# Altium schematic symbol library SignalCommunications.SCHLIB: 804 symbols (part 2 of 9) (continued)
## WE-LAN-10/100/1000-BASE-T,749020100
designator T?, comment <b>LAN-Transformer WE-LAN 10/10/1000 Base Tx</b><p> / - Compliant with IEEE 802.3 standards<br> / - SMD<p> / -- Ethernet<br> / -- Power over Ethernet<br> / -- 1 Gigabit Ethernet<br> / -- Compliant with most IC's for ethernet applications like Intel, AMD, Globespan and Realtek<br> / -- Hub, Router, Switch
MANUFACTURER: Würth Elektronik eiSos GmbH; CREATED-BY: Christin Zierenner; COMPANY-URL: http://www.we-online.de; CREATED-DATE: June 2012; DATASHEET-URL: http://katalog.we-online.de/kataloge/eisos/media/pdf/749020100.pdf
footprint 749020100
pins: 1 D+, 2 D-, 3 TD1, 6 TD2, 7 D1+, 8 D1-, 9 X1-, 10 X1+, 11 TX1, 14 TX, 15 X-, 16 X+

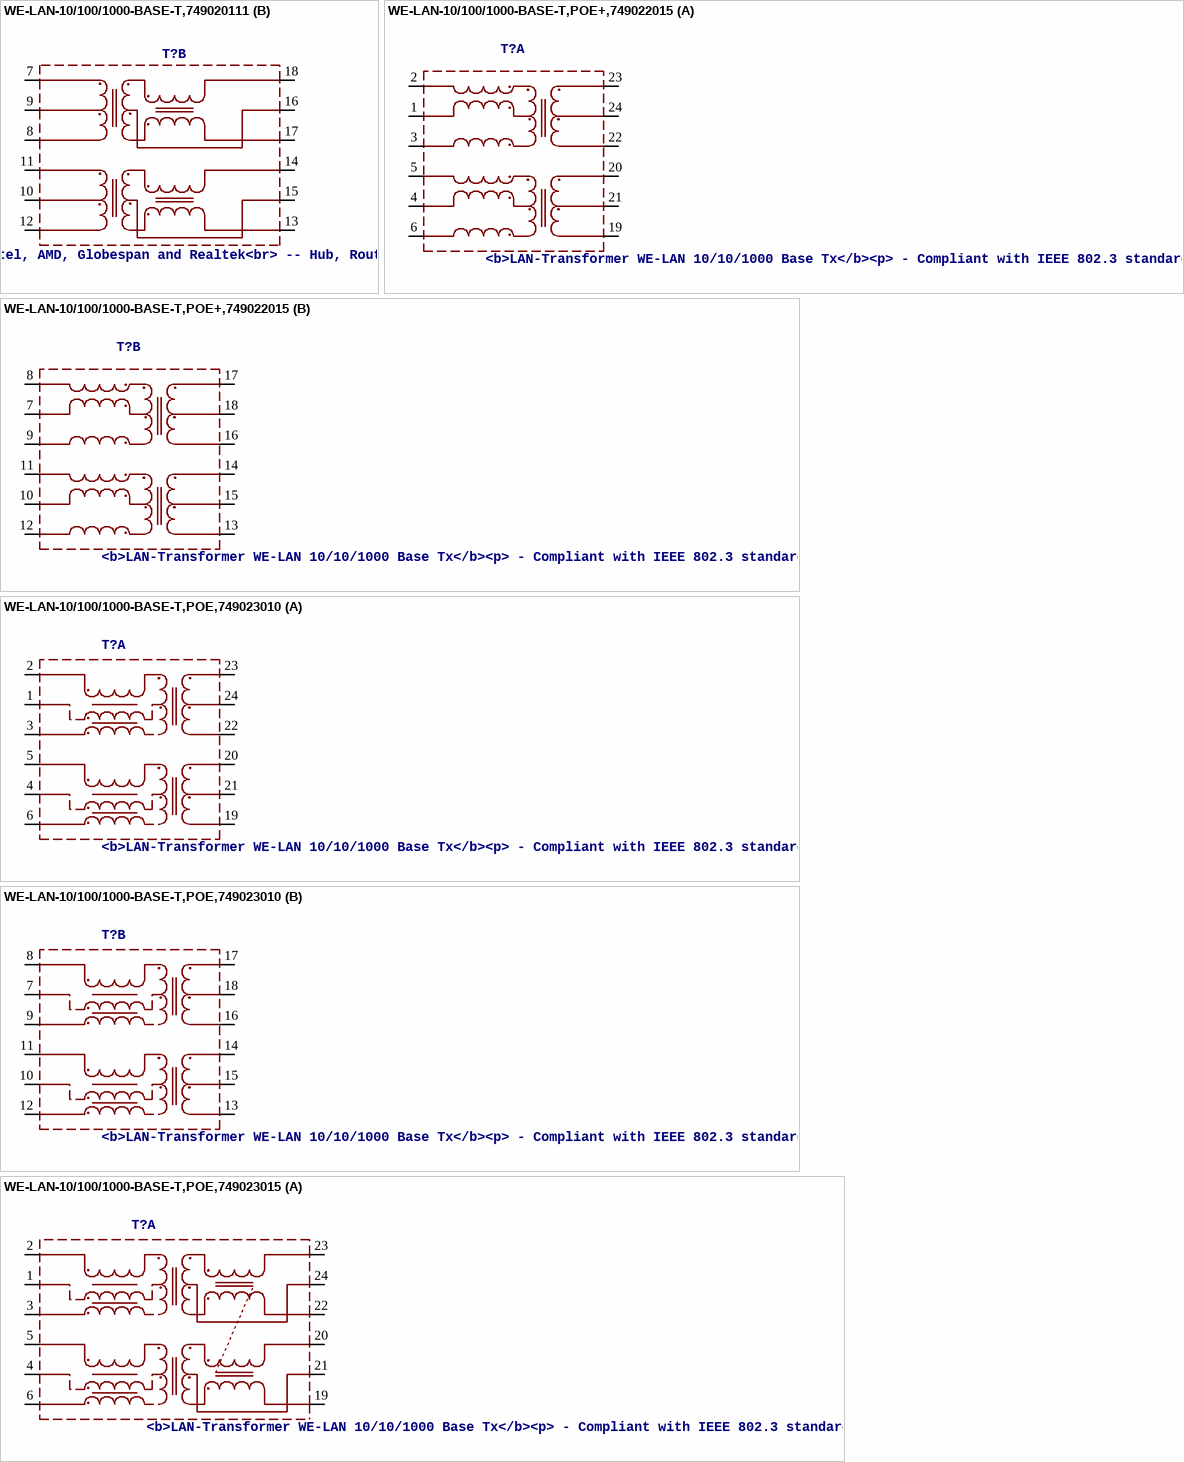
[diagram p7: symbols WE-LAN-10/100/1000-BASE-T,749020111 to WE-LAN-10/100/1000-BASE-T,POE,749023015]

## WE-LAN-10/100/1000-BASE-T,749020111
designator T?, comment <b>LAN-Transformer WE-LAN 10/10/1000 Base Tx</b><p> / - Compliant with IEEE 802.3 standards<br> / - SMD<p> / -- Ethernet<br> / -- Power over Ethernet<br> / -- 1 Gigabit Ethernet<br> / -- Compliant with most IC's for ethernet applications like Intel, AMD, Globespan and Realtek<br> / -- Hub, Router, Switch
MANUFACTURER: Würth Elektronik eiSos GmbH; CREATED-BY: Christin Zierenner; COMPANY-URL: http://www.we-online.de; CREATED-DATE: June 2012; DATASHEET-URL: http://katalog.we-online.de/kataloge/eisos/media/pdf/749020111.pdf
footprint 749020111
part A pins: 1 D1-, 2 D1A-, 3 TD1, 4 TD2, 5 D2-, 6 D2A-, 19 X2A-, 20 X2-, 21 TX2, 22 TX1, 23 X1A-, 24 X1-
part B pins: 7 D1-, 8 D1A-, 9 TD1, 10 TD2, 11 D2-, 12 D2A-, 13 X2A-, 14 X2-, 15 TX2, 16 TX1, 17 X1A-, 18 X1-

## WE-LAN-10/100/1000-BASE-T,POE+,749022015
designator T?, comment <b>LAN-Transformer WE-LAN 10/10/1000 Base Tx</b><p> / - Compliant with IEEE 802.3 standards<br> / - SMD<p> / -- Ethernet<br> / -- Power over Ethernet<br> / -- 1 Gigabit Ethernet<br> / -- Compliant with most IC's for ethernet applications like Intel, AMD, Globespan and Realtek<br> / -- Hub, Router, Switch
MANUFACTURER: Würth Elektronik eiSos GmbH; CREATED-BY: Christin Zierenner; COMPANY-URL: http://www.we-online.de; CREATED-DATE: June 2012; DATASHEET-URL: http://katalog.we-online.de/kataloge/eisos/media/pdf/749022015.pdf
footprint 749022015
part A pins: 1 TD1, 2 D1-, 3 D1A-, 4 TD2, 5 D2-, 6 D2A-, 19 X2A-, 20 X2-, 21 TX2, 22 X1A-, 23 X1-, 24 TX1
part B pins: 7 TD1, 8 D1-, 9 D1A-, 10 TD2, 11 D2-, 12 D2A-, 13 X2A-, 14 X2-, 15 TX2, 16 X1A-, 17 X1-, 18 TX1

## WE-LAN-10/100/1000-BASE-T,POE,749023010
designator T?, comment <b>LAN-Transformer WE-LAN 10/10/1000 Base Tx</b><p> / - Compliant with IEEE 802.3 standards<br> / - SMD<p> / -- Ethernet<br> / -- Power over Ethernet<br> / -- 1 Gigabit Ethernet<br> / -- Compliant with most IC's for ethernet applications like Intel, AMD, Globespan and Realtek<br> / -- Hub, Router, Switch
MANUFACTURER: Würth Elektronik eiSos GmbH; CREATED-BY: Christin Zierenner; COMPANY-URL: http://www.we-online.de; CREATED-DATE: June 2012; DATASHEET-URL: http://katalog.we-online.de/kataloge/eisos/media/pdf/749023010.pdf
footprint 749023010
part A pins: 1 TCT1, 2 TD1+, 3 TD1-, 4 TCT2, 5 TD2+, 6 TD2-, 19 MX2-, 20 MX2+, 21 MCT2, 22 MX1-, 23 MX1+, 24 MCT1
part B pins: 7 TCT1, 8 TD1+, 9 TD1-, 10 TCT2, 11 TD2+, 12 TD2-, 13 MX2-, 14 MX2+, 15 MCT2, 16 MX1-, 17 MX1+, 18 MCT1

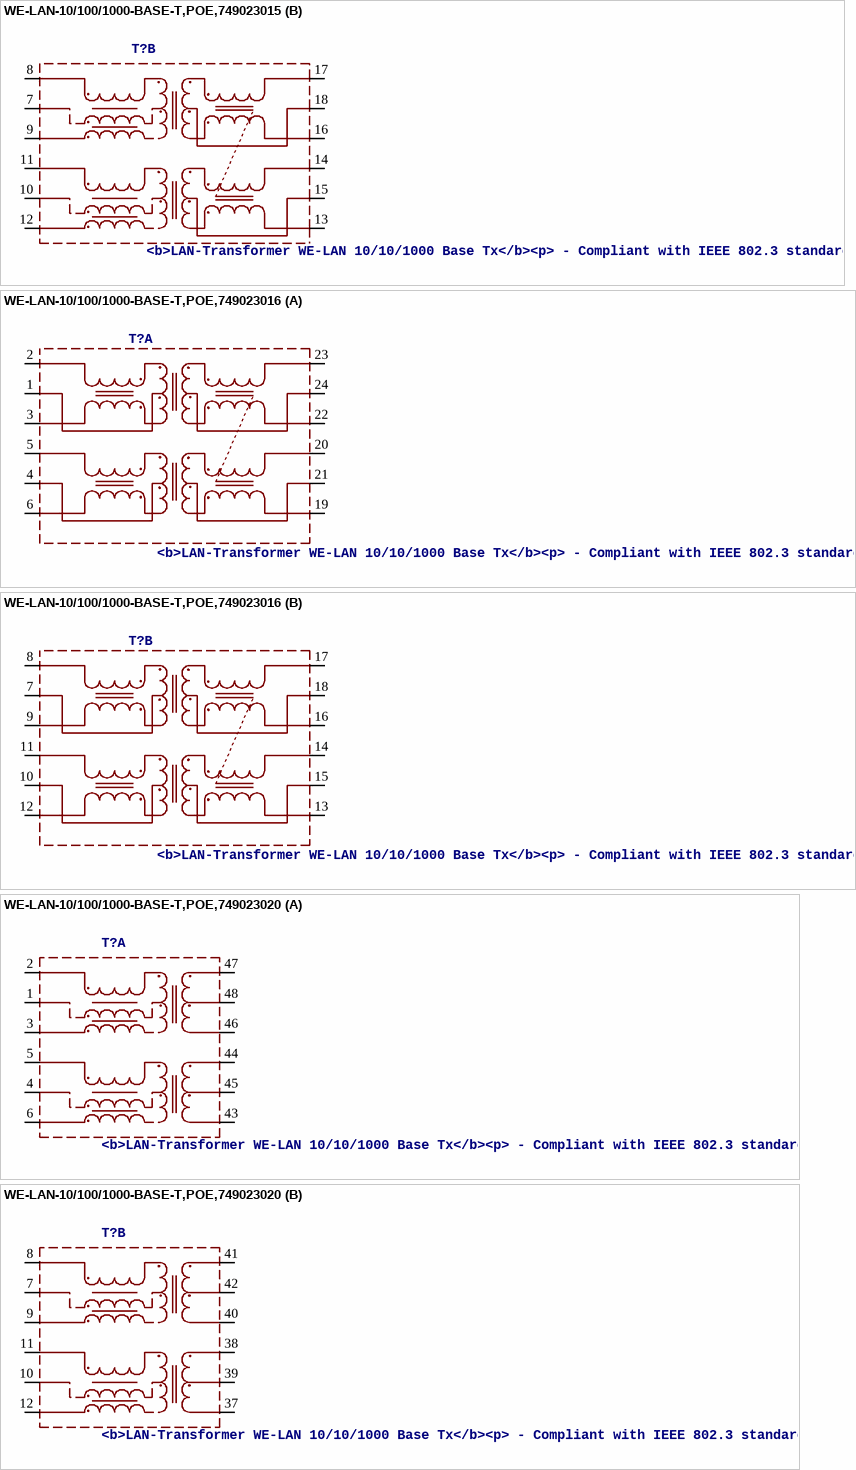
[diagram p8: symbols WE-LAN-10/100/1000-BASE-T,POE,749023015 to WE-LAN-10/100/1000-BASE-T,POE,749023020]

## WE-LAN-10/100/1000-BASE-T,POE,749023015
designator T?, comment <b>LAN-Transformer WE-LAN 10/10/1000 Base Tx</b><p> / - Compliant with IEEE 802.3 standards<br> / - SMD<p> / -- Ethernet<br> / -- Power over Ethernet<br> / -- 1 Gigabit Ethernet<br> / -- Compliant with most IC's for ethernet applications like Intel, AMD, Globespan and Realtek<br> / -- Hub, Router, Switch
MANUFACTURER: Würth Elektronik eiSos GmbH; CREATED-BY: Christin Zierenner; COMPANY-URL: http://www.we-online.de; CREATED-DATE: June 2012; DATASHEET-URL: http://katalog.we-online.de/kataloge/eisos/media/pdf/749023015.pdf
footprint 749023015
part A pins: 1 TD1, 2 D1+, 3 D1-, 4 TD2, 5 D2+, 6 D2-, 19 X2-, 20 X2+, 21 TX2, 22 X1-, 23 X1+, 24 TX1
part B pins: 7 TD1, 8 D1+, 9 D1-, 10 TD2, 11 D2+, 12 D2-, 13 X2-, 14 X2+, 15 TX2, 16 X1-, 17 X1+, 18 TX1

## WE-LAN-10/100/1000-BASE-T,POE,749023016
designator T?, comment <b>LAN-Transformer WE-LAN 10/10/1000 Base Tx</b><p> / - Compliant with IEEE 802.3 standards<br> / - SMD<p> / -- Ethernet<br> / -- Power over Ethernet<br> / -- 1 Gigabit Ethernet<br> / -- Compliant with most IC's for ethernet applications like Intel, AMD, Globespan and Realtek<br> / -- Hub, Router, Switch
MANUFACTURER: Würth Elektronik eiSos GmbH; CREATED-BY: Christin Zierenner; COMPANY-URL: http://www.we-online.de; CREATED-DATE: June 2012; DATASHEET-URL: http://katalog.we-online.de/kataloge/eisos/media/pdf/749023016.pdf
footprint 749023016
part A pins: 1 TD1, 2 D1+, 3 D1-, 4 TD2, 5 D2+, 6 D2-, 19 X2-, 20 X2+, 21 TX2, 22 X1-, 23 X1+, 24 TX1
part B pins: 7 TD1, 8 D1+, 9 D1-, 10 TD2, 11 D2+, 12 D2-, 13 X2-, 14 X2+, 15 TX2, 16 X1-, 17 X1+, 18 TX1

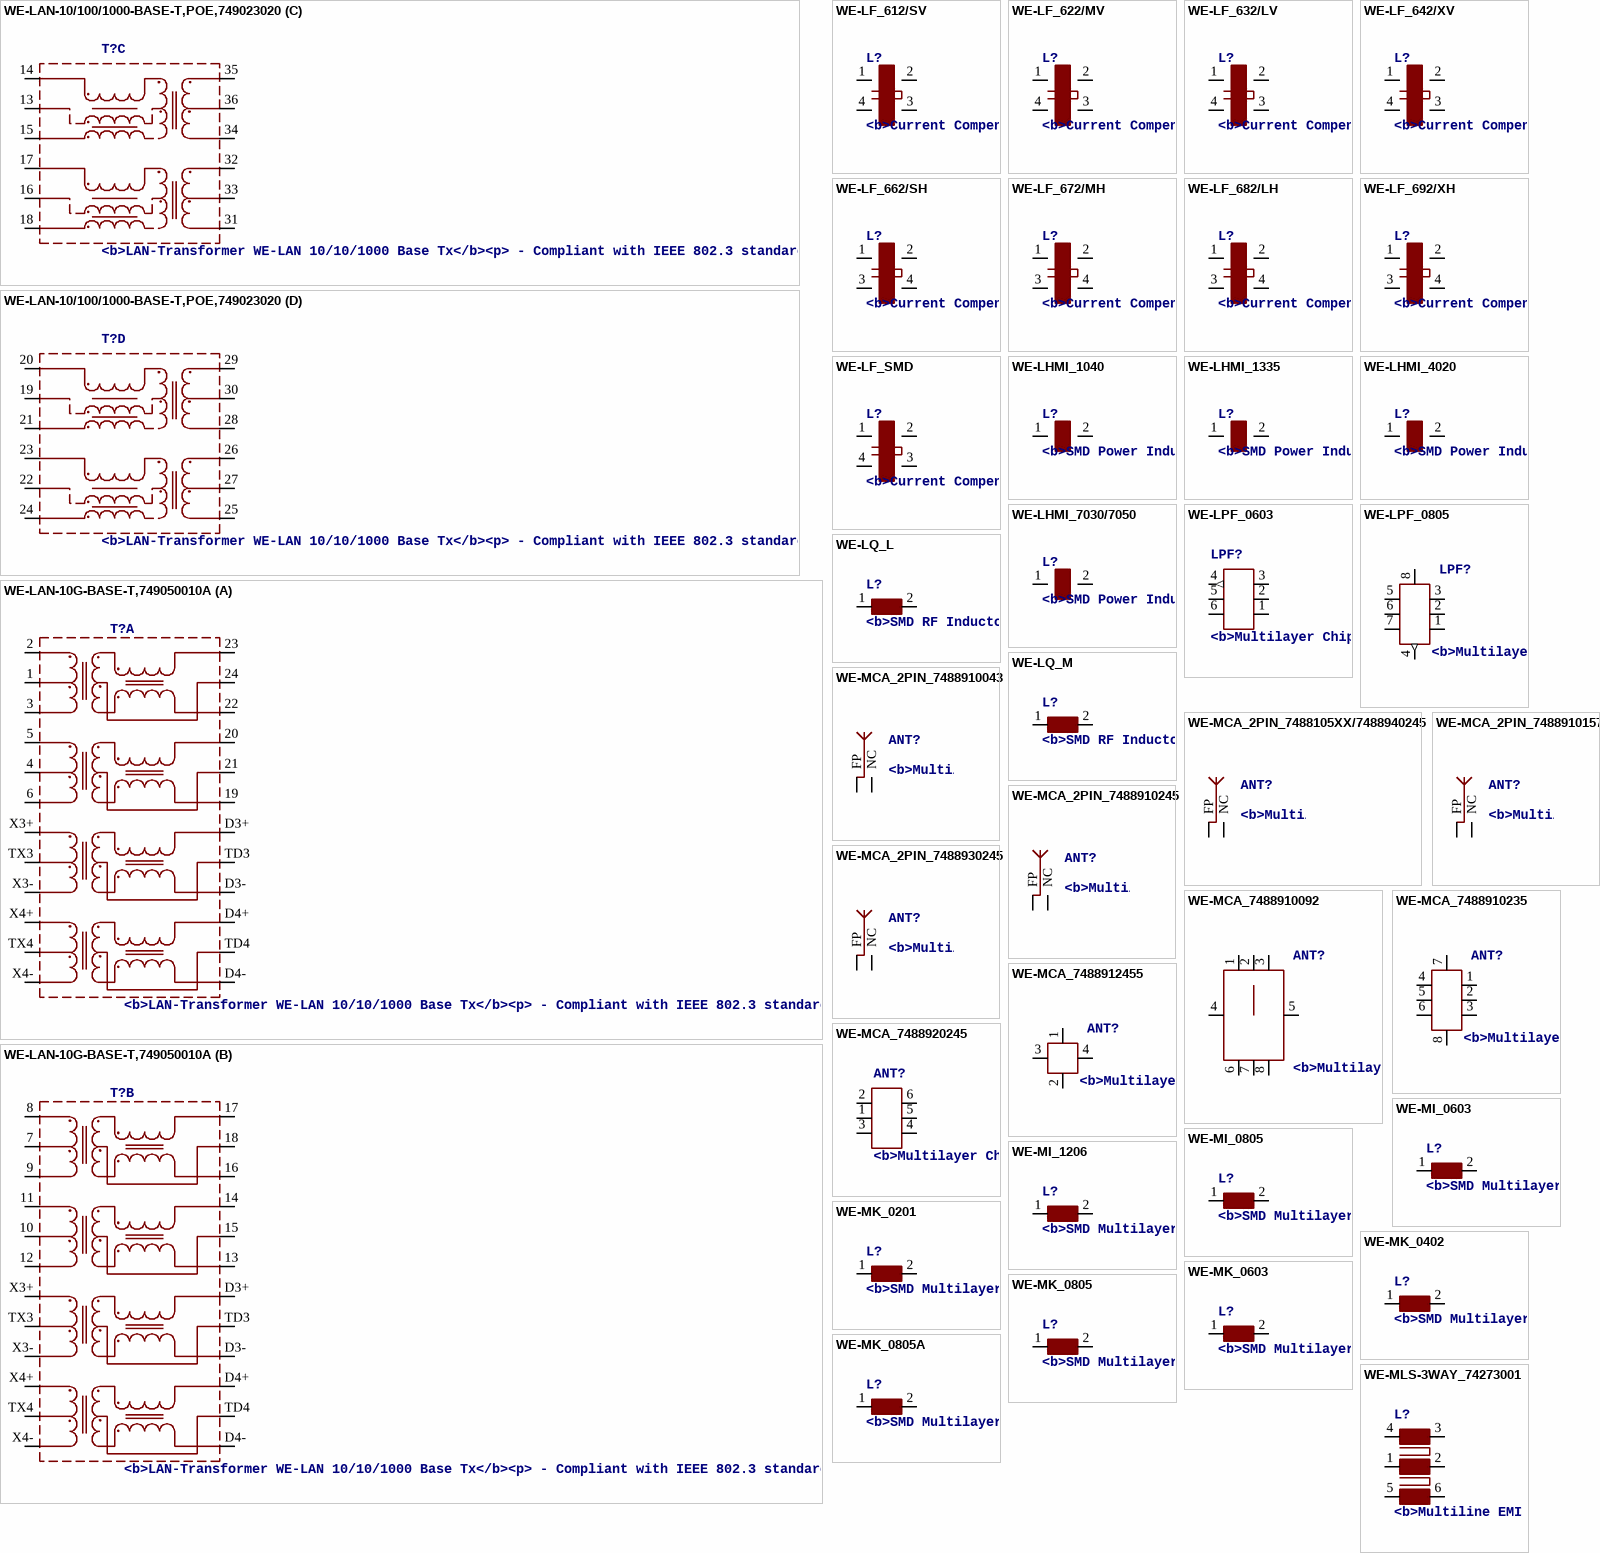
[diagram p9: symbols WE-LAN-10/100/1000-BASE-T,POE,749023020 to WE-MLS-3WAY_74273001]

## WE-LAN-10/100/1000-BASE-T,POE,749023020
designator T?, comment <b>LAN-Transformer WE-LAN 10/10/1000 Base Tx</b><p> / - Compliant with IEEE 802.3 standards<br> / - SMD<p> / -- Ethernet<br> / -- Power over Ethernet<br> / -- 1 Gigabit Ethernet<br> / -- Compliant with most IC's for ethernet applications like Intel, AMD, Globespan and Realtek<br> / -- Hub, Router, Switch
MANUFACTURER: Würth Elektronik eiSos GmbH; CREATED-BY: Christin Zierenner; COMPANY-URL: http://www.we-online.de; CREATED-DATE: June 2012; DATASHEET-URL: http://katalog.we-online.de/kataloge/eisos/media/pdf/749023020.pdf
footprint 749023020
part A pins: 1 TCT1, 2 TD1+, 3 TD1-, 4 TCT2, 5 TD2+, 6 TD2-, 43 MX2-, 44 MX2+, 45 MCT2, 46 MX1-, 47 MX1+, 48 MCT1
part B pins: 7 TCT1, 8 TD1+, 9 TD1-, 10 TCT2, 11 TD2+, 12 TD2-, 37 MX2-, 38 MX2+, 39 MCT2, 40 MX1-, 41 MX1+, 42 MCT1
part C pins: 13 TCT1, 14 TD1+, 15 TD1-, 16 TCT2, 17 TD2+, 18 TD2-, 31 MX2-, 32 MX2+, 33 MCT2, 34 MX1-, 35 MX1+, 36 MCT1
part D pins: 19 TCT1, 20 TD1+, 21 TD1-, 22 TCT2, 23 TD2+, 24 TD2-, 25 MX2-, 26 MX2+, 27 MCT2, 28 MX1-, 29 MX1+, 30 MCT1

## WE-LAN-10G-BASE-T,749050010A
designator T?, comment <b>LAN-Transformer WE-LAN 10/10/1000 Base Tx</b><p> / - Compliant with IEEE 802.3 standards<br> / - SMD<p> / -- Ethernet<br> / -- Power over Ethernet<br> / -- 10 Gigabit Ethernet<br> / -- Compliant with most IC's for ethernet applications like Intel, AMD, Globespan and Realtek<br> / -- Hub, Router, Switch
MANUFACTURER: Würth Elektronik eiSos GmbH; CREATED-BY: Christin Zierenner; COMPANY-URL: http://www.we-online.de; CREATED-DATE: June 2012; DATASHEET-URL: http://katalog.we-online.de/kataloge/eisos/media/pdf/749050010A.pdf
footprint 749050010A
part A pins: 1 TX1, 2 X1+, 3 X1-, 4 TX2, 5 X2+, 6 X2-, 19 D2-, 20 D2+, 21 TD2, 22 D1-, 23 D1+, 24 TD1, D3+, D3-, D4+, D4-, TD3, TD4, TX3, TX4, X3+, X3-, X4+, X4-
part B pins: 7 TX1, 8 X1+, 9 X1-, 10 TX2, 11 X2+, 12 X2-, 13 D2-, 14 D2+, 15 TD2, 16 D1-, 17 D1+, 18 TD1, D3+, D3-, D4+, D4-, TD3, TD4, TX3, TX4, X3+, X3-, X4+, X4-

## WE-LF_612/SV
designator L?, comment <b>Current Compensated Chokes WE-LF</b><p> / Is perfectly suitable for line filter circuits<br> / - Broadband screening because of the top-quality core / material even with the small size<br> / - Ring core choke with segment coiling<br> / - High interferences suppressions for common mode / interferences in low and middle frequency ranges<br> / - Low leakage field <br><br> / -- Line chokes for common mode filtering and protection<br> / -- BUS-systems (USB/CAN), telecommunications<br> / -- Filter for measurement signals<br>
footprint WE-LF_612/SV
pins: 1 3, 2 4, 3 2, 4 1

## WE-LF_622/MV
designator L?, comment <b>Current Compensated Chokes WE-LF</b><p> / Is perfectly suitable for line filter circuits<br> / - Broadband screening because of the top-quality core / material even with the small size<br> / - Ring core choke with segment coiling<br> / - High interferences suppressions for common mode / interferences in low and middle frequency ranges<br> / - Low leakage field <br><br> / -- Line chokes for common mode filtering and protection<br> / -- BUS-systems (USB/CAN), telecommunications<br> / -- Filter for measurement signals<br>
footprint WE-LF_622/MV
pins: 1 3, 2 4, 3 2, 4 1

## WE-LF_632/LV
designator L?, comment <b>Current Compensated Chokes WE-LF</b><p> / Is perfectly suitable for line filter circuits<br> / - Broadband screening because of the top-quality core / material even with the small size<br> / - Ring core choke with segment coiling<br> / - High interferences suppressions for common mode / interferences in low and middle frequency ranges<br> / - Low leakage field <br><br> / -- Line chokes for common mode filtering and protection<br> / -- BUS-systems (USB/CAN), telecommunications<br> / -- Filter for measurement signals<br>
footprint WE-LF_632/LV
pins: 1 3, 2 4, 3 2, 4 1

## WE-LF_642/XV
designator L?, comment <b>Current Compensated Chokes WE-LF</b><p> / Is perfectly suitable for line filter circuits<br> / - Broadband screening because of the top-quality core / material even with the small size<br> / - Ring core choke with segment coiling<br> / - High interferences suppressions for common mode / interferences in low and middle frequency ranges<br> / - Low leakage field <br><br> / -- Line chokes for common mode filtering and protection<br> / -- BUS-systems (USB/CAN), telecommunications<br> / -- Filter for measurement signals<br>
footprint WE-LF_642/XV
pins: 1 3, 2 4, 3 2, 4 1

## WE-LF_662/SH
designator L?, comment <b>Current Compensated Chokes WE-LF</b><p> / Is perfectly suitable for line filter circuits<br> / - Broadband screening because of the top-quality core / material even with the small size<br> / - Ring core choke with segment coiling<br> / - High interferences suppressions for common mode / interferences in low and middle frequency ranges<br> / - Low leakage field <br><br> / -- Line chokes for common mode filtering and protection<br> / -- BUS-systems (USB/CAN), telecommunications<br> / -- Filter for measurement signals<br>
footprint WE-LF_662/SH
pins: 1 3, 2 4, 3 1, 4 2

## WE-LF_672/MH
designator L?, comment <b>Current Compensated Chokes WE-LF</b><p> / Is perfectly suitable for line filter circuits<br> / - Broadband screening because of the top-quality core / material even with the small size<br> / - Ring core choke with segment coiling<br> / - High interferences suppressions for common mode / interferences in low and middle frequency ranges<br> / - Low leakage field <br><br> / -- Line chokes for common mode filtering and protection<br> / -- BUS-systems (USB/CAN), telecommunications<br> / -- Filter for measurement signals<br>
footprint WE-LF_672/MH
pins: 1 3, 2 4, 3 1, 4 2

## WE-LF_682/LH
designator L?, comment <b>Current Compensated Chokes WE-LF</b><p> / Is perfectly suitable for line filter circuits<br> / - Broadband screening because of the top-quality core / material even with the small size<br> / - Ring core choke with segment coiling<br> / - High interferences suppressions for common mode / interferences in low and middle frequency ranges<br> / - Low leakage field <br><br> / -- Line chokes for common mode filtering and protection<br> / -- BUS-systems (USB/CAN), telecommunications<br> / -- Filter for measurement signals<br>
footprint WE-LF_682/LH
pins: 1 3, 2 4, 3 1, 4 2

## WE-LF_692/XH
designator L?, comment <b>Current Compensated Chokes WE-LF</b><p> / Is perfectly suitable for line filter circuits<br> / - Broadband screening because of the top-quality core / material even with the small size<br> / - Ring core choke with segment coiling<br> / - High interferences suppressions for common mode / interferences in low and middle frequency ranges<br> / - Low leakage field <br><br> / -- Line chokes for common mode filtering and protection<br> / -- BUS-systems (USB/CAN), telecommunications<br> / -- Filter for measurement signals<br>
footprint WE-LF_692/XH
pins: 1 3, 2 4, 3 1, 4 2

## WE-LF_SMD
designator L?, comment <b>Current Compensated Chokes WE-LF SMD</b><p> / Is perfectly suitable for line filter circuits<br> / - Broadband screening because of the top-quality core / material even with the small size<br> / - Ring core choke with segment coiling<br> / - High interferences suppressions for common mode / interferences in low and middle frequency ranges<br> / - Low leakage field <br><br> / -- Line chokes for common mode filtering and protection<br> / -- BUS-systems (USB/CAN), telecommunications<br> / -- Filter for measurement signals<br>
footprint WE-LF_SMD
pins: 1 3, 2 4, 3 2, 4 1

## WE-LHMI_1040
designator L?, comment <b>SMD Power Inductor WE-LHMI</b><p> / - Compact design<br> / - Magnetically shielded<br> / - High current capability<br> / - Handles high transient current spikes<br> / - No acounstic noise and no leakage field<br> / - Frequency range up to 5MHz<br><br> / -- DC/DC converter for high current power supplies<br> / -- DC/DC converter for Field Programmable Gate Array (FPGA)<br> / -- POL converter<br> / -- Portable power like PDA, digital camera<br> / -- Mainboards / graphic cards<br> / -- Battery powerded devices
footprint WE-LHMI_1040
pins: 1, 2

## WE-LHMI_1335
designator L?, comment <b>SMD Power Inductor WE-LHMI</b><p> / - Compact design<br> / - Magnetically shielded<br> / - High current capability<br> / - Handles high transient current spikes<br> / - No acounstic noise and no leakage field<br> / - Frequency range up to 5MHz<br><br> / -- DC/DC converter for high current power supplies<br> / -- DC/DC converter for Field Programmable Gate Array (FPGA)<br> / -- POL converter<br> / -- Portable power like PDA, digital camera<br> / -- Mainboards / graphic cards<br> / -- Battery powerded devices
footprint WE-LHMI_1335
pins: 1, 2

## WE-LHMI_4020
designator L?, comment <b>SMD Power Inductor WE-LHMI</b><p> / - Compact design<br> / - Magnetically shielded<br> / - High current capability<br> / - Handles high transient current spikes<br> / - No acounstic noise and no leakage field<br> / - Frequency range up to 5MHz<br><br> / -- DC/DC converter for high current power supplies<br> / -- DC/DC converter for Field Programmable Gate Array (FPGA)<br> / -- POL converter<br> / -- Portable power like PDA, digital camera<br> / -- Mainboards / graphic cards<br> / -- Battery powerded devices
footprint WE-LHMI_4020
pins: 1, 2

## WE-LHMI_7030/7050
designator L?, comment <b>SMD Power Inductor WE-LHMI</b><p> / - Compact design<br> / - Magnetically shielded<br> / - High current capability<br> / - Handles high transient current spikes<br> / - No acounstic noise and no leakage field<br> / - Frequency range up to 5MHz<br><br> / -- DC/DC converter for high current power supplies<br> / -- DC/DC converter for Field Programmable Gate Array (FPGA)<br> / -- POL converter<br> / -- Portable power like PDA, digital camera<br> / -- Mainboards / graphic cards<br> / -- Battery powerded devices
footprint WE-LHMI_7030/7050
pins: 1, 2

## WE-LPF_0603
designator LPF?, comment <b>Multilayer Chip Low-Pass Filters WE-LPF SMD 0603</b><p> / - One inductor and three capacitors or two inductors and five capacitors in one component<br> / - Power capacity up to 3W<br> / - Low insertion loss and high attenuation in the stop-band<br><br> / -- RF-applications in the area of 0.8 to 6 GHz<br> / -- wireless communication systems like DECT,PACS,PHS,GSM, Bluetooth,...
footprint WE-LPF_0603
pins: 1 GND (power), 2 NC, 3 GND (power), 4 OUT (out), 5 GND (power), 6 IN

## WE-LPF_0805
designator LPF?, comment <b>Multilayer Chip Low-Pass Filters WE-LPF SMD 0603</b><p> / - One inductor and three capacitors or two inductors and five capacitors in one component<br> / - Power capacity up to 3W<br> / - Low insertion loss and high attenuation in the stop-band<br><br> / -- RF-applications in the area of 0.8 to 6 GHz<br> / -- wireless communication systems like DECT,PACS,PHS,GSM, Bluetooth,...
footprint WE-LPF_0805
pins: 1 GND (power), 2 NC, 3 GND (power), 4 OUT (out), 5 GND (power), 6 NC, 7 GND (power), 8 IN

## WE-LQ_L
designator L?, comment <b>SMD RF Inductor WE-LQ</b><p> / - High Q at high frequences<br> / - Low DC-resistance<br> / - Miniature chip inductor wound on a special ferrite core<p> / -- Low power DC/DC-converters from Linear Technology, / National Semiconductor, Texas Instruments and / Fairchild Semiconductor ect.<br> / -- Test & measurement equipment<br> / -- EMI-Filtering<br> / -- RF-circuit
footprint WE-LQ_L
pins: 1, 2

## WE-LQ_M
designator L?, comment <b>SMD RF Inductor WE-LQ</b><p> / - High Q at high frequences<br> / - Low DC-resistance<br> / - Miniature chip inductor wound on a special ferrite core<p> / -- Low power DC/DC-converters from Linear Technology, / National Semiconductor, Texas Instruments and / Fairchild Semiconductor ect.<br> / -- Test & measurement equipment<br> / -- EMI-Filtering<br> / -- RF-circuit
footprint WE-LQ_M
pins: 1, 2

## WE-MCA_2PIN_7488105XX/7488940245
designator ANT?, comment <b>Multilayer Chip Antenna WE-MCA</b><br><br> / - SMD Multilayer Chip Antenna<br> / - Extremely low profile<br> / - Very light component<br> / - Operating temperature: -40°C to +85°C<br> / - Power capacity: 3 W max.<br> / - Omni-directional<br><br> / -- For RF application in the area of 2,4 GHz<br> / -- WLAN<br> / -- Home RF (868 MHz)<br> / -- Bluetooth applications<br> / -- IEEE 802.11a/b<br> / -- GPS<br> / -- GSM<br> / -- WIMAX applications
footprint WE-MCA_7488105XX/7488940245
pins: 1 FP, 2 NC

## WE-MCA_2PIN_7488910043
designator ANT?, comment <b>Multilayer Chip Antenna WE-MCA</b><br><br> / - SMD Multilayer Chip Antenna<br> / - Extremely low profile<br> / - Very light component<br> / - Operating temperature: -40°C to +85°C<br> / - Power capacity: 3 W max.<br> / - Omni-directional<br><br> / -- For RF application in the area of 2,4 GHz<br> / -- WLAN<br> / -- Home RF (868 MHz)<br> / -- Bluetooth applications<br> / -- IEEE 802.11a/b<br> / -- GPS<br> / -- GSM<br> / -- WIMAX applications
footprint WE-MCA_7488910043
pins: 1 FP, 2 NC

## WE-MCA_2PIN_7488910157
designator ANT?, comment <b>Multilayer Chip Antenna WE-MCA</b><br><br> / - SMD Multilayer Chip Antenna<br> / - Extremely low profile<br> / - Very light component<br> / - Operating temperature: -40°C to +85°C<br> / - Power capacity: 3 W max.<br> / - Omni-directional<br><br> / -- For RF application in the area of 2,4 GHz<br> / -- WLAN<br> / -- Home RF (868 MHz)<br> / -- Bluetooth applications<br> / -- IEEE 802.11a/b<br> / -- GPS<br> / -- GSM<br> / -- WIMAX applications
footprint WE-MCA_7488910157
pins: 1 FP, 2 NC

## WE-MCA_2PIN_7488910245
designator ANT?, comment <b>Multilayer Chip Antenna WE-MCA</b><br><br> / - SMD Multilayer Chip Antenna<br> / - Extremely low profile<br> / - Very light component<br> / - Operating temperature: -40°C to +85°C<br> / - Power capacity: 3 W max.<br> / - Omni-directional<br><br> / -- For RF application in the area of 2,4 GHz<br> / -- WLAN<br> / -- Home RF (868 MHz)<br> / -- Bluetooth applications<br> / -- IEEE 802.11a/b<br> / -- GPS<br> / -- GSM<br> / -- WIMAX applications
footprint WE-MCA_7488910245
pins: 1 NC, 2 FP

## WE-MCA_2PIN_7488930245
designator ANT?, comment <b>Multilayer Chip Antenna WE-MCA</b><br><br> / - SMD Multilayer Chip Antenna<br> / - Extremely low profile<br> / - Very light component<br> / - Operating temperature: -40°C to +85°C<br> / - Power capacity: 3 W max.<br> / - Omni-directional<br><br> / -- For RF application in the area of 2,4 GHz<br> / -- WLAN<br> / -- Home RF (868 MHz)<br> / -- Bluetooth applications<br> / -- IEEE 802.11a/b<br> / -- GPS<br> / -- GSM<br> / -- WIMAX applications
footprint WE-MCA_7488930245
pins: 1 FP, 2 NC

## WE-MCA_7488910092
designator ANT?, comment <b>Multilayer Chip Antenna WE-MCA</b><br><br> / - SMD Multilayer Chip Antenna<br> / - Extremely low profile<br> / - Very light component<br> / - Operating temperature: -40°C to +85°C<br> / - Power capacity: 3 W max.<br> / - Omni-directional<br><br> / -- For RF application in the area of 2,4 GHz<br> / -- WLAN<br> / -- Home RF (868 MHz)<br> / -- Bluetooth applications<br> / -- IEEE 802.11a/b<br> / -- GPS<br> / -- GSM<br> / -- WIMAX applications
footprint WE-MCA_7488910092
pins: 1 NC, 2 FD, 3 NC, 4 NC, 5 NC, 6 NC, 7 NC, 8 NC

## WE-MCA_7488910235
designator ANT?, comment <b>Multilayer Chip Antenna WE-MCA</b><br><br> / - SMD Multilayer Chip Antenna<br> / - Extremely low profile<br> / - Very light component<br> / - Operating temperature: -40°C to +85°C<br> / - Power capacity: 3 W max.<br> / - Omni-directional<br><br> / -- For RF application in the area of 2,4 GHz<br> / -- WLAN<br> / -- Home RF (868 MHz)<br> / -- Bluetooth applications<br> / -- IEEE 802.11a/b<br> / -- GPS<br> / -- GSM<br> / -- WIMAX applications
footprint WE-MCA_7488910235
pins: 1 GND (power), 2 FD, 3 GND (power), 4 NC, 5 NC, 6 NC, 7 NC, 8 NC

## WE-MCA_7488912455
designator ANT?, comment <b>Multilayer Chip Antenna WE-MCA</b><br><br> / - SMD Multilayer Chip Antenna<br> / - Extremely low profile<br> / - Very light component<br> / - Operating temperature: -40°C to +85°C<br> / - Power capacity: 3 W max.<br> / - Omni-directional<br><br> / -- For RF application in the area of 2,4 GHz<br> / -- WLAN<br> / -- Home RF (868 MHz)<br> / -- Bluetooth applications<br> / -- IEEE 802.11a/b<br> / -- GPS<br> / -- GSM<br> / -- WIMAX applications
footprint WE-MCA_7488912455
pins: 1 NC, 2 NC, 3 FD_LB, 4 FD_HB

## WE-MCA_7488920245
designator ANT?, comment <b>Multilayer Chip Antenna WE-MCA</b><br><br> / - SMD Multilayer Chip Antenna<br> / - Extremely low profile<br> / - Very light component<br> / - Operating temperature: -40°C to +85°C<br> / - Power capacity: 3 W max.<br> / - Omni-directional<br><br> / -- For RF application in the area of 2,4 GHz<br> / -- WLAN<br> / -- Home RF (868 MHz)<br> / -- Bluetooth applications<br> / -- IEEE 802.11a/b<br> / -- GPS<br> / -- GSM<br> / -- WIMAX applications
footprint WE-MCA_7488920245
pins: 1 FD, 2 GND (power), 3 GND (power), 4 NC, 5 NC, 6 NC

## WE-MI_0603
designator L?, comment <b>SMD Multilayer Inductor WE-MI</b><p> / - Excellent solderability and high heat resistance<br> / - Smallest inductor possible for less space needed on the printed circuit board and therefore perfect suitable for high density mounting<br> / - No cross coupling of closed magnetic circuits<p> / -- Filter switches<br> / -- Oscillators<br> / -- Adjustment networks<br> / -- Discretely built T- or Pi-Filter<br> / -- Used as inductive element in filters and resonant circuits of higher quality with requirement of low coupling by external signals
footprint 0603
pins: 1, 2

## WE-MI_0805
designator L?, comment <b>SMD Multilayer Inductor WE-MI</b><p> / - Excellent solderability and high heat resistance<br> / - Smallest inductor possible for less space needed on the printed circuit board and therefore perfect suitable for high density mounting<br> / - No cross coupling of closed magnetic circuits<p> / -- Filter switches<br> / -- Oscillators<br> / -- Adjustment networks<br> / -- Discretely built T- or Pi-Filter<br> / -- Used as inductive element in filters and resonant circuits of higher quality with requirement of low coupling by external signals
footprint 0805
pins: 1, 2

## WE-MI_1206
designator L?, comment <b>SMD Multilayer Inductor WE-MI</b><p> / - Excellent solderability and high heat resistance<br> / - Smallest inductor possible for less space needed on the printed circuit board and therefore perfect suitable for high density mounting<br> / - No cross coupling of closed magnetic circuits<p> / -- Filter switches<br> / -- Oscillators<br> / -- Adjustment networks<br> / -- Discretely built T- or Pi-Filter<br> / -- Used as inductive element in filters and resonant circuits of higher quality with requirement of low coupling by external signals
footprint 1206
pins: 1, 2

## WE-MK_0201
designator L?, comment <b>SMD Multilayer Ceramic Inductors WE-MK</b><br><br> / - Windings printed on ceramic substrate<br> / - Extremely high SRF > 15 GHz<br> / - Inductance is stable over temperature<br><br> / -- High frequency circuits<br> / -- Bluetooth<br> / -- Wireless LAN<br> / -- Filter circuits<br>
footprint 0201
pins: 1, 2

## WE-MK_0402
designator L?, comment <b>SMD Multilayer Ceramic Inductors WE-MK</b><br><br> / - Windings printed on ceramic substrate<br> / - Extremely high SRF > 15 GHz<br> / - Inductance is stable over temperature<br><br> / -- High frequency circuits<br> / -- Bluetooth<br> / -- Wireless LAN<br> / -- Filter circuits<br>
footprint 0402
pins: 1, 2

## WE-MK_0603
designator L?, comment <b>SMD Multilayer Ceramic Inductors WE-MK</b><br><br> / - Windings printed on ceramic substrate<br> / - Extremely high SRF > 15 GHz<br> / - Inductance is stable over temperature<br><br> / -- High frequency circuits<br> / -- Bluetooth<br> / -- Wireless LAN<br> / -- Filter circuits<br>
footprint 0603
pins: 1, 2

## WE-MK_0805
designator L?, comment <b>SMD Multilayer Ceramic Inductors WE-MK</b><br><br> / - Windings printed on ceramic substrate<br> / - Extremely high SRF > 15 GHz<br> / - Inductance is stable over temperature<br><br> / -- High frequency circuits<br> / -- Bluetooth<br> / -- Wireless LAN<br> / -- Filter circuits<br>
footprint 0805
pins: 1, 2

## WE-MK_0805A
designator L?, comment <b>SMD Multilayer Ceramic Inductors WE-MK</b><br><br> / - Windings printed on ceramic substrate<br> / - Extremely high SRF > 15 GHz<br> / - Inductance is stable over temperature<br><br> / -- High frequency circuits<br> / -- Bluetooth<br> / -- Wireless LAN<br> / -- Filter circuits<br>
footprint 0805A
pins: 1, 2

## WE-MLS-3WAY_74273001
designator L?, comment <b>Multiline EMI Suppression Ferrite</b><p> / - Filter for common mode or differential mode<br> / - High rated current with typ. 4 A<br> / - High impedance common mode inductor with 2x2 winding made by PCB line connection<br> / - Broardband litering because of the NiZn-ferrite core<br> / - RF- common mode inductor for 2,3 or 4 lines in one component<p> / -- Perfect suitable for absorption of common or differential / mode interferences in the field of EMC<br> / -- High current DC output filters of power supplies e.g. / battery chargers, industrial power supplies<br> / -- With one turn the component performes like a 3 or 4 times common mode chock for the signal
footprint WE-3WAY_74273001
pins: 1 2, 2 5, 3 6, 4 1, 5 3, 6 4

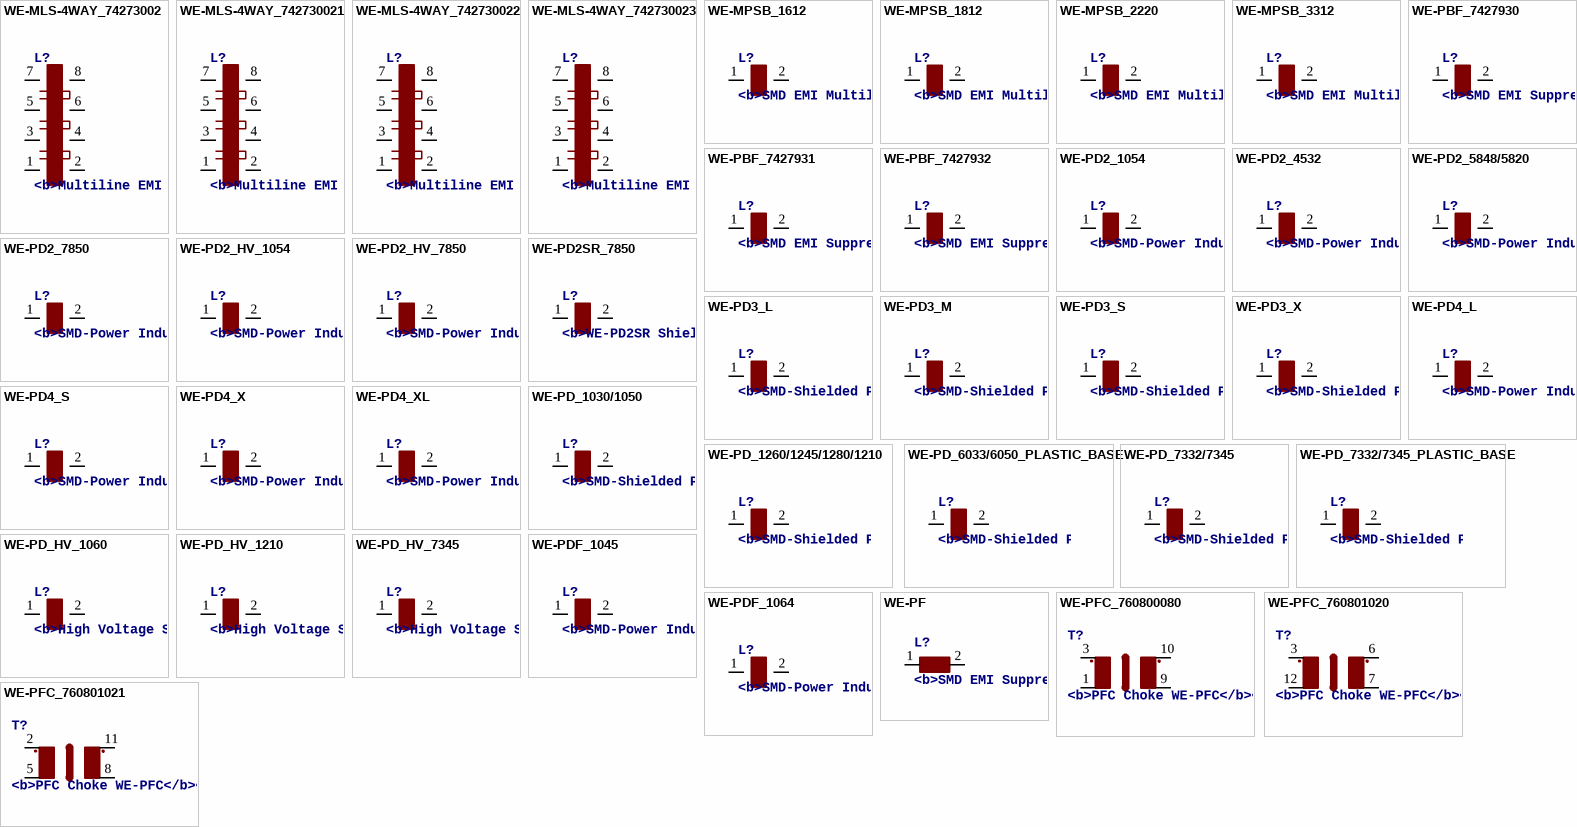
[diagram p10: symbols WE-MLS-4WAY_74273002 to WE-PFC_760801021]

## WE-MLS-4WAY_74273002
designator L?, comment <b>Multiline EMI Suppression Ferrite</b><p> / - Filter for common mode or differential mode<br> / - High rated current with typ. 4 A<br> / - High impedance common mode inductor with 2x2 winding made by PCB line connection<br> / - Broardband litering because of the NiZn-ferrite core<br> / - RF- common mode inductor for 2,3 or 4 lines in one component<p> / -- Perfect suitable for absorption of common or differential / mode interferences in the field of EMC<br> / -- High current DC output filters of power supplies e.g. / battery chargers, industrial power supplies<br> / -- With one turn the component performes like a 3 or 4 times common mode chock for the signal
footprint WE-4WAY_74273002
pins: 1 4, 2 5, 3, 4 6, 5 2, 6 7, 7 1, 8

## WE-MLS-4WAY_742730021
designator L?, comment <b>Multiline EMI Suppression Ferrite</b><p> / - Filter for common mode or differential mode<br> / - High rated current with typ. 4 A<br> / - High impedance common mode inductor with 2x2 winding made by PCB line connection<br> / - Broardband litering because of the NiZn-ferrite core<br> / - RF- common mode inductor for 2,3 or 4 lines in one component<p> / -- Perfect suitable for absorption of common or differential / mode interferences in the field of EMC<br> / -- High current DC output filters of power supplies e.g. / battery chargers, industrial power supplies<br> / -- With one turn the component performes like a 3 or 4 times common mode chock for the signal
footprint WE-4WAY_742730021
pins: 1 4, 2 5, 3, 4 6, 5 2, 6 7, 7 1, 8

## WE-MLS-4WAY_742730022
designator L?, comment <b>Multiline EMI Suppression Ferrite</b><p> / - Filter for common mode or differential mode<br> / - High rated current with typ. 4 A<br> / - High impedance common mode inductor with 2x2 winding made by PCB line connection<br> / - Broardband litering because of the NiZn-ferrite core<br> / - RF- common mode inductor for 2,3 or 4 lines in one component<p> / -- Perfect suitable for absorption of common or differential / mode interferences in the field of EMC<br> / -- High current DC output filters of power supplies e.g. / battery chargers, industrial power supplies<br> / -- With one turn the component performes like a 3 or 4 times common mode chock for the signal
footprint WE-4WAY_742730022
pins: 1 4, 2 5, 3, 4 6, 5 2, 6 7, 7 1, 8

## WE-MLS-4WAY_742730023
designator L?, comment <b>Multiline EMI Suppression Ferrite</b><p> / - Filter for common mode or differential mode<br> / - High rated current with typ. 4 A<br> / - High impedance common mode inductor with 2x2 winding made by PCB line connection<br> / - Broardband litering because of the NiZn-ferrite core<br> / - RF- common mode inductor for 2,3 or 4 lines in one component<p> / -- Perfect suitable for absorption of common or differential / mode interferences in the field of EMC<br> / -- High current DC output filters of power supplies e.g. / battery chargers, industrial power supplies<br> / -- With one turn the component performes like a 3 or 4 times common mode chock for the signal
footprint WE-4WAY_742730023
pins: 1 4, 2 5, 3, 4 6, 5 2, 6 7, 7 1, 8